# Altium footprint library WR-TBL_Pluggable PCB Header.PcbLib: 719 footprints (part 9 of 45)
Each footprint in its own frame and in the unit in brackets; x right, y up, seen from the top. Pads: shape width x height; smd on the part's side, far side on the other; paste and mask are expansions set on the pad; w line width, h text height; cw(c..) or ccw(c..) is an arc to the next point about the centre after c.
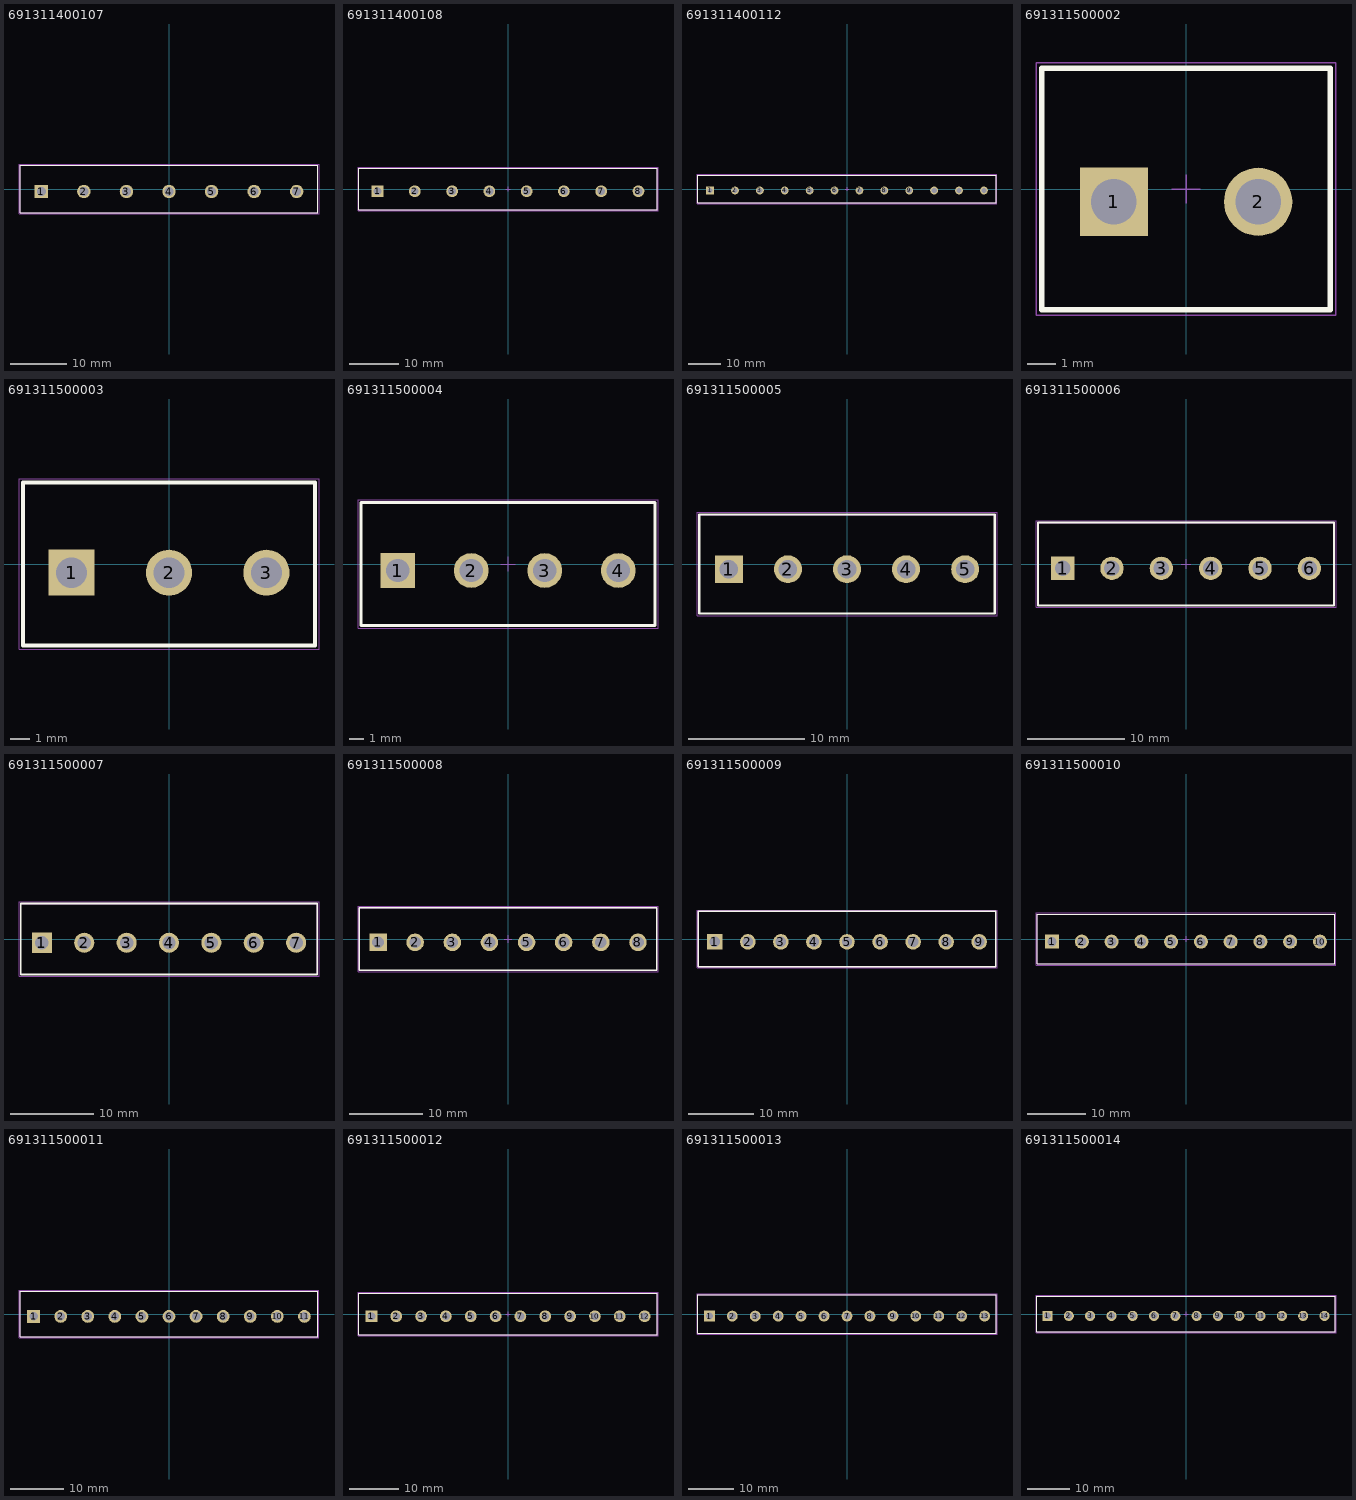
[diagram p8: the footprints below, top view; thin cyan lines are the x and y axes]

## 691311400107 [mm] "7.62 mm - Closed Vertical PCB Header - 7p"
height 12
pads (7):
  rect 2.4x2.4 hole 1.6: 1(-22.86,-0.45)
  round 2.4 hole 1.6: 2(-15.24,-0.45) 3(-7.62,-0.45) 4(0,-0.45) 5(7.62,-0.45) 6(15.24,-0.45) 7(22.86,-0.45)
Top Overlay:
  lines w0.2: -26.66,-4.25 26.66,-4.25 26.66,4.25 -26.66,4.25 -26.66,-4.25
Mechanical 13:
  lines w0.1: -26.66,-4.25 -26.66,4.25 26.66,4.25 26.66,-4.25 -26.66,-4.25
Mechanical 15:
  lines w0.05: -0.5,0 0.5,0 ; 0,-0.5 0,0.5 ; -26.86,-4.45 26.86,-4.45 26.86,4.45 -26.86,4.45 -26.86,-4.45
3D body "691311400107.stp": height 12.05, standoff -3.95, extent -26.67,-4.25 26.67,4.25

## 691311400108 [mm] "7.62 mm - Closed Vertical PCB Header - 8p"
height 12
pads (8):
  rect 2.4x2.4 hole 1.6: 1(-26.67,-0.45)
  round 2.4 hole 1.6: 2(-19.05,-0.45) 3(-11.43,-0.45) 4(-3.81,-0.45) 5(3.81,-0.45) 6(11.43,-0.45) 7(19.05,-0.45) 8(26.67,-0.45)
Top Overlay:
  lines w0.2: -30.47,-4.25 30.47,-4.25 30.47,4.25 -30.47,4.25 -30.47,-4.25
Mechanical 13:
  lines w0.1: -30.47,-4.25 -30.47,4.25 30.47,4.25 30.47,-4.25 -30.47,-4.25
Mechanical 15:
  lines w0.05: -0.5,0 0.5,0 ; 0,-0.5 0,0.5 ; -30.67,-4.45 30.67,-4.45 30.67,4.45 -30.67,4.45 -30.67,-4.45
3D body "691311400108.stp": height 12.05, standoff -3.95, extent -30.48,-4.25 30.48,4.25

## 691311400112 [mm] "7.62 mm - Closed Vertical PCB Header - 12p"
height 12
pads (12):
  rect 2.4x2.4 hole 1.6: 1(-41.91,-0.45)
  round 2.4 hole 1.6: 2(-34.29,-0.45) 3(-26.67,-0.45) 4(-19.05,-0.45) 5(-11.43,-0.45) 6(-3.81,-0.45) 7(3.81,-0.45) 8(11.43,-0.45) 9(19.05,-0.45) 10(26.67,-0.45) 11(34.29,-0.45) 12(41.91,-0.45)
Top Overlay:
  lines w0.2: -45.71,-4.25 -45.71,4.25 45.71,4.25 45.71,-4.25 -45.71,-4.25
Mechanical 13:
  lines w0.1: -45.71,-4.25 45.71,-4.25 45.71,4.25 -45.71,4.25 -45.71,-4.25
Mechanical 15:
  lines w0.05: -0.5,0 0.5,0 ; 0,-0.5 0,0.5 ; -45.91,-4.45 -45.91,4.45 45.91,4.45 45.91,-4.45 -45.91,-4.45
3D body "691311400112.stp": height 12.05, standoff -3.95, extent -45.72,-4.25 45.72,4.25

## 691311500002 [mm] "5,08mm - PCB Headers - Vertical - Opened ends -02p"
height 12
pads (2):
  rect 2.4x2.4 hole 1.6: 1(-2.54,-0.45)
  round 2.4 hole 1.6: 2(2.54,-0.45)
Top Overlay:
  lines w0.2: -5.08,-4.25 -5.08,4.25 5.08,4.25 5.08,-4.25 -5.08,-4.25
Mechanical 13:
  lines w0.1: -5.08,-4.25 5.08,-4.25 5.08,4.25 -5.08,4.25 -5.08,-4.25
Mechanical 15:
  lines w0.05: -0.5,0 0.5,0 ; 0,-0.5 0,0.5 ; -5.28,-4.45 -5.28,4.45 5.28,4.45 5.28,-4.45 -5.28,-4.45
3D body "691311500002.stp": height 12.05, standoff -3.95, extent -5.08,-4.25 5.08,4.25

## 691311500003 [mm] "5,08mm - PCB Headers - Vertical - Opened ends -03p"
height 12
pads (3):
  rect 2.4x2.4 hole 1.6: 1(-5.08,-0.45)
  round 2.4 hole 1.6: 2(0,-0.45) 3(5.08,-0.45)
Top Overlay:
  lines w0.2: -7.62,-4.25 7.62,-4.25 7.62,4.25 -7.62,4.25 -7.62,-4.25
Mechanical 13:
  lines w0.1: -7.62,-4.25 -7.62,4.25 7.62,4.25 7.62,-4.25 -7.62,-4.25
Mechanical 15:
  lines w0.05: -0.5,0 0.5,0 ; 0,-0.5 0,0.5 ; -7.82,-4.45 7.82,-4.45 7.82,4.45 -7.82,4.45 -7.82,-4.45
3D body "691311500003.stp": height 12.05, standoff -3.95, extent -7.62,-4.25 7.62,4.25

## 691311500004 [mm] "5,08mm - PCB Headers - Vertical - Opened ends -04p"
height 12
pads (4):
  rect 2.4x2.4 hole 1.6: 1(-7.62,-0.45)
  round 2.4 hole 1.6: 2(-2.54,-0.45) 3(2.54,-0.45) 4(7.62,-0.45)
Top Overlay:
  lines w0.2: -10.16,-4.25 -10.16,4.25 10.16,4.25 10.16,-4.25 -10.16,-4.25
Mechanical 13:
  lines w0.1: -10.16,-4.25 10.16,-4.25 10.16,4.25 -10.16,4.25 -10.16,-4.25
Mechanical 15:
  lines w0.05: -0.5,0 0.5,0 ; 0,-0.5 0,0.5 ; -10.36,-4.45 -10.36,4.45 10.36,4.45 10.36,-4.45 -10.36,-4.45
3D body "691311500004.stp": height 12.05, standoff -3.95, extent -10.16,-4.25 10.16,4.25

## 691311500005 [mm] "5,08mm - PCB Headers - Vertical - Opened ends -05p"
height 12
pads (5):
  rect 2.4x2.4 hole 1.6: 1(-10.16,-0.45)
  round 2.4 hole 1.6: 2(-5.08,-0.45) 3(0,-0.45) 4(5.08,-0.45) 5(10.16,-0.45)
Top Overlay:
  lines w0.2: -12.7,-4.25 12.7,-4.25 12.7,4.25 -12.7,4.25 -12.7,-4.25
Mechanical 13:
  lines w0.1: -12.7,-4.25 -12.7,4.25 12.7,4.25 12.7,-4.25 -12.7,-4.25
Mechanical 15:
  lines w0.05: -0.5,0 0.5,0 ; 0,-0.5 0,0.5 ; -12.9,-4.45 12.9,-4.45 12.9,4.45 -12.9,4.45 -12.9,-4.45
3D body "691311500005.stp": height 12.05, standoff -3.95, extent -12.7,-4.25 12.7,4.25

## 691311500006 [mm] "5,08mm - PCB Headers - Vertical - Opened ends -06p"
height 12
pads (6):
  rect 2.4x2.4 hole 1.6: 1(-12.7,-0.45)
  round 2.4 hole 1.6: 2(-7.62,-0.45) 3(-2.54,-0.45) 4(2.54,-0.45) 5(7.62,-0.45) 6(12.7,-0.45)
Top Overlay:
  lines w0.2: -15.24,-4.25 15.24,-4.25 15.24,4.25 -15.24,4.25 -15.24,-4.25
Mechanical 13:
  lines w0.1: -15.24,-4.25 -15.24,4.25 15.24,4.25 15.24,-4.25 -15.24,-4.25
Mechanical 15:
  lines w0.05: -0.5,0 0.5,0 ; 0,-0.5 0,0.5 ; -15.44,-4.45 15.44,-4.45 15.44,4.45 -15.44,4.45 -15.44,-4.45
3D body "691311500006.stp": height 12.05, standoff -3.95, extent -15.24,-4.25 15.24,4.25

## 691311500007 [mm] "5,08mm - PCB Headers - Vertical - Opened ends -07p"
height 12
pads (7):
  rect 2.4x2.4 hole 1.6: 1(-15.24,-0.45)
  round 2.4 hole 1.6: 2(-10.16,-0.45) 3(-5.08,-0.45) 4(0,-0.45) 5(5.08,-0.45) 6(10.16,-0.45) 7(15.24,-0.45)
Top Overlay:
  lines w0.2: -17.78,-4.25 17.78,-4.25 17.78,4.25 -17.78,4.25 -17.78,-4.25
Mechanical 13:
  lines w0.1: -17.78,-4.25 -17.78,4.25 17.78,4.25 17.78,-4.25 -17.78,-4.25
Mechanical 15:
  lines w0.05: -0.5,0 0.5,0 ; 0,-0.5 0,0.5 ; -17.98,-4.45 17.98,-4.45 17.98,4.45 -17.98,4.45 -17.98,-4.45
3D body "691311500007.stp": height 12.05, standoff -3.95, extent -17.78,-4.25 17.78,4.25

## 691311500008 [mm] "5,08mm - PCB Headers - Vertical - Opened ends -08p"
height 12
pads (8):
  rect 2.4x2.4 hole 1.6: 1(-17.78,-0.45)
  round 2.4 hole 1.6: 2(-12.7,-0.45) 3(-7.62,-0.45) 4(-2.54,-0.45) 5(2.54,-0.45) 6(7.62,-0.45) 7(12.7,-0.45) 8(17.78,-0.45)
Top Overlay:
  lines w0.2: -20.32,-4.25 -20.32,4.25 20.32,4.25 20.32,-4.25 -20.32,-4.25
Mechanical 13:
  lines w0.1: -20.32,-4.25 20.32,-4.25 20.32,4.25 -20.32,4.25 -20.32,-4.25
Mechanical 15:
  lines w0.05: -0.5,0 0.5,0 ; 0,-0.5 0,0.5 ; -20.52,-4.45 -20.52,4.45 20.52,4.45 20.52,-4.45 -20.52,-4.45
3D body "691311500008.stp": height 12.05, standoff -3.95, extent -20.32,-4.25 20.32,4.25

## 691311500009 [mm] "5,08mm - PCB Headers - Vertical - Opened ends -09p"
height 12
pads (9):
  rect 2.4x2.4 hole 1.6: 1(-20.32,-0.45)
  round 2.4 hole 1.6: 2(-15.24,-0.45) 3(-10.16,-0.45) 4(-5.08,-0.45) 5(0,-0.45) 6(5.08,-0.45) 7(10.16,-0.45) 8(15.24,-0.45) 9(20.32,-0.45)
Top Overlay:
  lines w0.2: -22.86,-4.25 -22.86,4.25 22.86,4.25 22.86,-4.25 -22.86,-4.25
Mechanical 13:
  lines w0.1: -22.86,-4.25 22.86,-4.25 22.86,4.25 -22.86,4.25 -22.86,-4.25
Mechanical 15:
  lines w0.05: -0.5,0 0.5,0 ; 0,-0.5 0,0.5 ; -23.06,-4.45 -23.06,4.45 23.06,4.45 23.06,-4.45 -23.06,-4.45
3D body "691311500009.stp": height 12.05, standoff -3.95, extent -22.86,-4.25 22.86,4.25

## 691311500010 [mm] "5,08mm - PCB Headers - Vertical - Opened ends -10p"
height 12
pads (10):
  rect 2.4x2.4 hole 1.6: 1(-22.86,-0.45)
  round 2.4 hole 1.6: 2(-17.78,-0.45) 3(-12.7,-0.45) 4(-7.62,-0.45) 5(-2.54,-0.45) 6(2.54,-0.45) 7(7.62,-0.45) 8(12.7,-0.45) 9(17.78,-0.45) 10(22.86,-0.45)
Top Overlay:
  lines w0.2: -25.4,-4.25 25.4,-4.25 25.4,4.25 -25.4,4.25 -25.4,-4.25
Mechanical 13:
  lines w0.1: -25.4,-4.25 -25.4,4.25 25.4,4.25 25.4,-4.25 -25.4,-4.25
Mechanical 15:
  lines w0.05: -0.5,0 0.5,0 ; 0,-0.5 0,0.5 ; -25.6,-4.45 25.6,-4.45 25.6,4.45 -25.6,4.45 -25.6,-4.45
3D body "691311500010.stp": height 12.05, standoff -3.95, extent -25.4,-4.25 25.4,4.25

## 691311500011 [mm] "5,08mm - PCB Headers - Vertical - Opened ends -11p"
height 12
pads (11):
  rect 2.4x2.4 hole 1.6: 1(-25.4,-0.45)
  round 2.4 hole 1.6: 2(-20.32,-0.45) 3(-15.24,-0.45) 4(-10.16,-0.45) 5(-5.08,-0.45) 6(0,-0.45) 7(5.08,-0.45) 8(10.16,-0.45) 9(15.24,-0.45) 10(20.32,-0.45) 11(25.4,-0.45)
Top Overlay:
  lines w0.2: -27.94,-4.25 27.94,-4.25 27.94,4.25 -27.94,4.25 -27.94,-4.25
Mechanical 13:
  lines w0.1: -27.94,-4.25 -27.94,4.25 27.94,4.25 27.94,-4.25 -27.94,-4.25
Mechanical 15:
  lines w0.05: -0.5,0 0.5,0 ; 0,-0.5 0,0.5 ; -28.14,-4.45 28.14,-4.45 28.14,4.45 -28.14,4.45 -28.14,-4.45
3D body "691311500011.stp": height 12.05, standoff -3.95, extent -27.94,-4.25 27.94,4.25

## 691311500012 [mm] "5,08mm - PCB Headers - Vertical - Opened ends -12p"
height 12
pads (12):
  rect 2.4x2.4 hole 1.6: 1(-27.94,-0.45)
  round 2.4 hole 1.6: 2(-22.86,-0.45) 3(-17.78,-0.45) 4(-12.7,-0.45) 5(-7.62,-0.45) 6(-2.54,-0.45) 7(2.54,-0.45) 8(7.62,-0.45) 9(12.7,-0.45) 10(17.78,-0.45) 11(22.86,-0.45) 12(27.94,-0.45)
Top Overlay:
  lines w0.2: -30.48,-4.25 30.48,-4.25 30.48,4.25 -30.48,4.25 -30.48,-4.25
Mechanical 13:
  lines w0.1: -30.48,-4.25 -30.48,4.25 30.48,4.25 30.48,-4.25 -30.48,-4.25
Mechanical 15:
  lines w0.05: -0.5,0 0.5,0 ; 0,-0.5 0,0.5 ; -30.68,-4.45 30.68,-4.45 30.68,4.45 -30.68,4.45 -30.68,-4.45
3D body "691311500012.stp": height 12.05, standoff -3.95, extent -30.48,-4.25 30.48,4.25

## 691311500013 [mm] "5,08mm - PCB Headers - Vertical - Opened ends -13p"
height 12
pads (13):
  rect 2.4x2.4 hole 1.6: 1(-30.48,-0.45)
  round 2.4 hole 1.6: 2(-25.4,-0.45) 3(-20.32,-0.45) 4(-15.24,-0.45) 5(-10.16,-0.45) 6(-5.08,-0.45) 7(0,-0.45) 8(5.08,-0.45) 9(10.16,-0.45) 10(15.24,-0.45) 11(20.32,-0.45) 12(25.4,-0.45) 13(30.48,-0.45)
Top Overlay:
  lines w0.2: -33.02,-4.25 33.02,-4.25 33.02,4.25 -33.02,4.25 -33.02,-4.25
Mechanical 13:
  lines w0.1: -33.02,-4.25 -33.02,4.25 33.02,4.25 33.02,-4.25 -33.02,-4.25
Mechanical 15:
  lines w0.05: -0.5,0 0.5,0 ; 0,-0.5 0,0.5 ; -33.22,-4.45 33.22,-4.45 33.22,4.45 -33.22,4.45 -33.22,-4.45
3D body "691311500013.stp": height 12.05, standoff -3.95, extent -33.02,-4.25 33.02,4.25

## 691311500014 [mm] "5,08mm - PCB Headers - Vertical - Opened ends -14p"
height 12
pads (14):
  rect 2.4x2.4 hole 1.6: 1(-33.02,-0.45)
  round 2.4 hole 1.6: 2(-27.94,-0.45) 3(-22.86,-0.45) 4(-17.78,-0.45) 5(-12.7,-0.45) 6(-7.62,-0.45) 7(-2.54,-0.45) 8(2.54,-0.45) 9(7.62,-0.45) 10(12.7,-0.45) 11(17.78,-0.45) 12(22.86,-0.45) 13(27.94,-0.45) 14(33.02,-0.45)
Top Overlay:
  lines w0.2: -35.56,-4.25 35.56,-4.25 35.56,4.25 -35.56,4.25 -35.56,-4.25
Mechanical 13:
  lines w0.1: -35.56,-4.25 -35.56,4.25 35.56,4.25 35.56,-4.25 -35.56,-4.25
Mechanical 15:
  lines w0.05: -0.5,0 0.5,0 ; 0,-0.5 0,0.5 ; -35.76,-4.45 35.76,-4.45 35.76,4.45 -35.76,4.45 -35.76,-4.45
3D body "691311500014.stp": height 12.05, standoff -3.95, extent -35.56,-4.25 35.56,4.25